# Altium footprint library LC-Standard-FootPrints-AD-V1.00工程师同事给的标准库（含3D）.PcbLib: 463 footprints (part 12 of 29)
Each footprint in its own frame and in the unit in brackets; x right, y up, seen from the top. Pads: shape width x height; smd on the part's side, far side on the other; paste and mask are expansions set on the pad; w line width, h text height; cw(c..) or ccw(c..) is an arc to the next point about the centre after c.
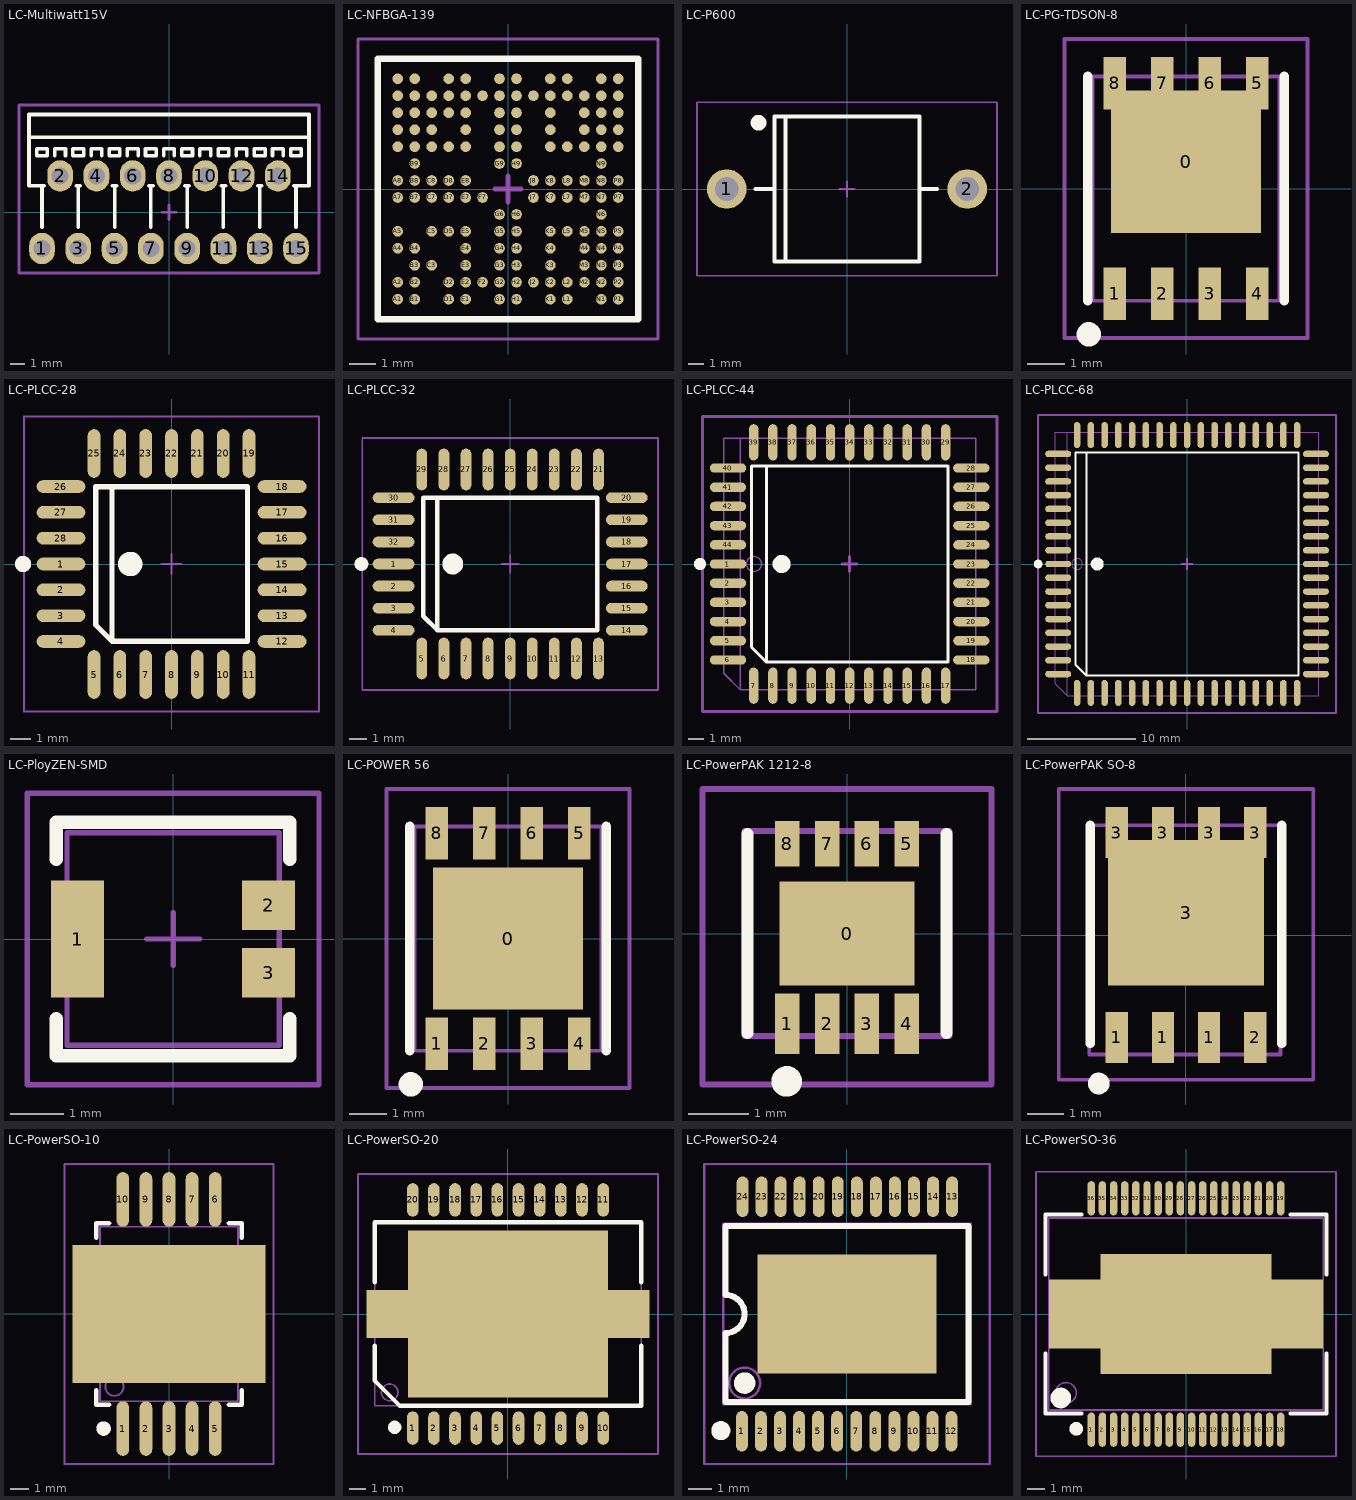
[diagram p11: the footprints below, top view; thin cyan lines are the x and y axes]

## LC-Multiwatt15V [mm]
pads (15):
  oval 1.8x2.2 hole 1.2: 1(-8.89,-2.54) 2(-7.62,2.54) 3(-6.35,-2.54) 4(-5.08,2.54) 5(-3.81,-2.54) 6(-2.54,2.54) 7(-1.27,-2.54) 8(0,2.54) 9(1.27,-2.54) 10(2.54,2.54) 11(3.81,-2.54) 12(5.08,2.54) 13(6.35,-2.54) 14(7.62,2.54) 15(8.89,-2.54)
Top Overlay:
  lines w0.254: -8.89,-1.06 -8.89,1.84 ; -8.74,1.84 -9.8,1.84 -9.8,5.24 ; -7.995,3.94 -7.995,4.44 -7.245,4.44 -7.245,3.94 ; -6.5,1.84 -6.2,1.84 ; -6.35,-1.06 -6.35,1.84 ; -5.455,3.94 -5.455,4.44 -4.705,4.44 -4.705,3.94 ; -3.96,1.84 -3.66,1.84 ; -3.81,-1.06 -3.81,1.84 ; -2.915,3.94 -2.915,4.44 -2.165,4.44 -2.165,3.94 ; -1.42,1.84 -1.12,1.84 ; -1.27,-1.06 -1.27,1.84 ; -0.375,3.94 -0.375,4.44 0.375,4.44 0.375,3.94 ; 1.12,1.84 1.42,1.84 ; 1.27,-1.06 1.27,1.84 ; 2.165,3.94 2.165,4.44 2.915,4.44 2.915,3.94 ; 3.66,1.84 3.96,1.84 ; 3.81,-1.06 3.81,1.84 ; 4.705,3.94 4.705,4.44 5.455,4.44 5.455,3.94 ; 6.2,1.84 6.5,1.84 ; 6.35,-1.06 6.35,1.84 ; 7.245,3.94 7.245,4.44 7.995,4.44 7.995,3.94 ; 8.74,1.84 9.8,1.84 9.8,5.24 ; 8.89,-1.06 8.89,1.84 ; -9.8,5.24 9.8,5.24 ; -9.8,5.24 -9.8,6.84 9.8,6.84 9.8,5.24 ; -9.265,3.94 -8.515,3.94 -8.515,4.44 -9.265,4.44 -9.265,3.94 ; -6.725,3.94 -5.975,3.94 -5.975,4.44 -6.725,4.44 -6.725,3.94 ; -4.185,3.94 -3.435,3.94 -3.435,4.44 -4.185,4.44 -4.185,3.94 ; -1.645,3.94 -1.645,4.44 -0.895,4.44 -0.895,3.94 -1.645,3.94 ; 0.895,3.94 1.645,3.94 1.645,4.44 0.895,4.44 0.895,3.94 ; 3.435,3.94 4.185,3.94 4.185,4.44 3.435,4.44 3.435,3.94 ; 5.975,3.94 6.725,3.94 6.725,4.44 5.975,4.44 5.975,3.94 ; 8.515,3.94 8.515,4.44 9.265,4.44 9.265,3.94 8.515,3.94
Mechanical 15:
  lines w0.2: -0.5,0 0.5,0 ; 0,-0.5 0,0.5 ; -10.5,-4.25 10.5,-4.25 10.5,7.5 -10.5,7.5 -10.5,-4.25

## LC-NFBGA-139 [mm]
pads (139):
  round 0.41 smd: A1(-4.225,-4.225) A2(-4.225,-3.575) A4(-4.225,-2.275) A5(-4.225,-1.625) A7(-4.225,-0.325) A8(-4.225,0.325) A10(-4.225,1.625) A11(-4.225,2.275) A12(-4.225,2.925) A13(-4.225,3.575) A14(-4.225,4.225) B1(-3.575,-4.225) B2(-3.575,-3.575) B3(-3.575,-2.925) B4(-3.575,-2.275) B7(-3.575,-0.325) B8(-3.575,0.325) B9(-3.575,0.975) B10(-3.575,1.625) B11(-3.575,2.275) B12(-3.575,2.925) B13(-3.575,3.575) B14(-3.575,4.225) C3(-2.925,-2.925) C5(-2.925,-1.625) C7(-2.925,-0.325) C8(-2.925,0.325) C10(-2.925,1.625) C11(-2.925,2.275) C12(-2.925,2.925) C13(-2.925,3.575) D1(-2.275,-4.225) D2(-2.275,-3.575) D5(-2.275,-1.625) D7(-2.275,-0.325) D8(-2.275,0.325) D10(-2.275,1.625) D12(-2.275,2.925) D13(-2.275,3.575) D14(-2.275,4.225) E1(-1.625,-4.225) E2(-1.625,-3.575) E3(-1.625,-2.925) E4(-1.625,-2.275) E5(-1.625,-1.625) E7(-1.625,-0.325) E8(-1.625,0.325) E10(-1.625,1.625) E11(-1.625,2.275) E12(-1.625,2.925) E13(-1.625,3.575) E14(-1.625,4.225) F2(-0.975,-3.575) F7(-0.975,-0.325) F13(-0.975,3.575) G1(-0.325,-4.225) G2(-0.325,-3.575) G3(-0.325,-2.925) G4(-0.325,-2.275) G5(-0.325,-1.625) G6(-0.325,-0.975) G9(-0.325,0.975) G10(-0.325,1.625) G11(-0.325,2.275) G12(-0.325,2.925) G13(-0.325,3.575) G14(-0.325,4.225) H1(0.325,-4.225) H2(0.325,-3.575) H3(0.325,-2.925) H4(0.325,-2.275) H5(0.325,-1.625) H6(0.325,-0.975) H9(0.325,0.975) H10(0.325,1.625) H11(0.325,2.275) H12(0.325,2.925) H13(0.325,3.575) H14(0.325,4.225) J2(0.975,-3.575) J7(0.975,-0.325) J8(0.975,0.325) J13(0.975,3.575) K1(1.625,-4.225) K2(1.625,-3.575) K3(1.625,-2.925) K4(1.625,-2.275) K5(1.625,-1.625) K7(1.625,-0.325) K8(1.625,0.325) K10(1.625,1.625) K11(1.625,2.275) K12(1.625,2.925) K13(1.625,3.575) K14(1.625,4.225) L1(2.275,-4.225) L2(2.275,-3.575) L5(2.275,-1.625) L7(2.275,-0.325) L8(2.275,0.325) L10(2.275,1.625) L13(2.275,3.575) L14(2.275,4.225) M2(2.925,-3.575) M3(2.925,-2.925) M4(2.925,-2.275) M5(2.925,-1.625) M7(2.925,-0.325) M8(2.925,0.325) M10(2.925,1.625) M11(2.925,2.275) M12(2.925,2.925) M13(2.925,3.575) N1(3.575,-4.225) N2(3.575,-3.575) N3(3.575,-2.925) N4(3.575,-2.275) N5(3.575,-1.625) N6(3.575,-0.975) N7(3.575,-0.325) N8(3.575,0.325) N9(3.575,0.975) N10(3.575,1.625) N11(3.575,2.275) N12(3.575,2.925) N13(3.575,3.575) N14(3.575,4.225) P1(4.225,-4.225) P2(4.225,-3.575) P3(4.225,-2.925) P4(4.225,-2.275) P5(4.225,-1.625) P7(4.225,-0.325) P8(4.225,0.325) P10(4.225,1.625) P11(4.225,2.275) P12(4.225,2.925) P13(4.225,3.575) P14(4.225,4.225)
Top Overlay:
  lines w0.254: -5,-5 5,-5 5,5 -5,5 -5,-5
Mechanical 15:
  lines w0.1: -5.75,-5.75 -5.75,5.75 5.75,5.75 5.75,-5.75 -5.75,-5.75
  lines w0.2: -0.5,0 0,0 ; 0,-0.5 0,0 ; 0,0.5 0,0 ; 0.5,0 0,0

## LC-P600 [mm]
pads (2):
  round 2.5 hole 1.5: 1(-7.62,0) 2(7.62,0)
Top Overlay:
  circle w0.5: c-5.6,4.2 r0.25
  lines w0.254: -5.8,0 -4.6,0 ; -3.9,-4.6 -3.9,4.6 ; 4.6,0 5.7,0 ; -4.6,-4.6 -4.6,4.6 4.6,4.6 4.6,-4.6 -4.6,-4.6
Mechanical 15:
  lines w0.1: -0.5,0 0.5,0 ; 0,-0.5 0,0.5 ; -9.5,-5.5 9.5,-5.5 9.5,5.5 -9.5,5.5 -9.5,-5.5

## LC-PG-TDSON-8 [mm]
pads (9):
  rect 4x3.81 smd: 0(0,0.716)
  rect 0.61x1.4 smd: 1(-1.905,-2.816) 2(-0.635,-2.816) 3(0.635,-2.816) 4(1.905,-2.816) 5(1.905,2.816) 6(0.635,2.816) 7(-0.635,2.816) 8(-1.905,2.816)
Top Overlay:
  circle w0.4: c-2.6,-3.9 r0.125
  lines w0.254: -2.63,-3 -2.63,3 ; 2.63,-3 2.63,3
Mechanical 13:
  lines w0.1: -2.5,-3 2.5,-3 2.5,3 -2.5,3 -2.5,-3
Mechanical 15:
  lines w0.1: -0.5,0 0.5,0 ; 0,-0.5 0,0.5 ; -3.25,-4 -3.25,4 3.25,4 3.25,-4 -3.25,-4

## LC-PLCC-28 [mm]
pads (28):
  oval 2.4x0.62 smd: 1(-5.435,0) 2(-5.435,-1.27) 3(-5.435,-2.54) 4(-5.435,-3.81) 12(5.435,-3.81) 13(5.435,-2.54) 14(5.435,-1.27) 15(5.435,0) 16(5.435,1.27) 17(5.435,2.54) 18(5.435,3.81) 26(-5.435,3.81) 27(-5.435,2.54) 28(-5.435,1.27)
  oval 0.62x2.4 smd: 5(-3.81,-5.435) 6(-2.54,-5.435) 7(-1.27,-5.435) 8(0,-5.435) 9(1.27,-5.435) 10(2.54,-5.435) 11(3.81,-5.435) 19(3.81,5.435) 20(2.54,5.435) 21(1.27,5.435) 22(0,5.435) 23(-1.27,5.435) 24(-2.54,5.435) 25(-3.81,5.435)
Top Overlay:
  circle w0.4: c-7.3,0 r0.2
  circle w0.6: c-2.03,0 r0.3
  lines w0.254: -2.93,3.8 -2.93,-3.8 ; -2.93,-3.8 -3.73,-3 -3.73,3.8 3.73,3.8 3.73,-3.8 -2.93,-3.8
Mechanical 15:
  lines w0.1: -0.5,0 0.5,0 ; 0,-0.5 0,0.5 ; -7.25,-7.25 -7.25,7.25 7.25,7.25 7.25,-7.25 -7.25,-7.25

## LC-PLCC-32 [mm]
pads (32):
  oval 2.4x0.62 smd: 1(-6.705,0) 2(-6.705,-1.27) 3(-6.705,-2.54) 4(-6.705,-3.81) 14(6.705,-3.81) 15(6.705,-2.54) 16(6.705,-1.27) 17(6.705,0) 18(6.705,1.27) 19(6.705,2.54) 20(6.705,3.81) 30(-6.705,3.81) 31(-6.705,2.54) 32(-6.705,1.27)
  oval 0.62x2.4 smd: 5(-5.08,-5.435) 6(-3.81,-5.435) 7(-2.54,-5.435) 8(-1.27,-5.435) 9(0,-5.435) 10(1.27,-5.435) 11(2.54,-5.435) 12(3.81,-5.435) 13(5.08,-5.435) 21(5.08,5.435) 22(3.81,5.435) 23(2.54,5.435) 24(1.27,5.435) 25(0,5.435) 26(-1.27,5.435) 27(-2.54,5.435) 28(-3.81,5.435) 29(-5.08,5.435)
Top Overlay:
  circle w0.6: c-3.3,0 r0.3
  circle w0.4: c-8.55,0 r0.2
  lines w0.254: -4.2,3.8 -4.2,-3.8 ; -4.2,-3.8 -5,-3 -5,3.8 5,3.8 5,-3.8 -4.2,-3.8
Mechanical 15:
  lines w0.1: -0.5,0 0.5,0 ; 0,-0.5 0,0.5 ; -8.5,-7.25 8.5,-7.25 8.5,7.25 -8.5,7.25 -8.5,-7.25

## LC-PLCC-44 [mm]
pads (44):
  oval 2.4x0.62 smd: 1(-8.05,0) 2(-8.05,-1.27) 3(-8.05,-2.54) 4(-8.05,-3.81) 5(-8.05,-5.08) 6(-8.05,-6.35) 18(8.05,-6.35) 19(8.05,-5.08) 20(8.05,-3.81) 21(8.05,-2.54) 22(8.05,-1.27) 23(8.05,0) 24(8.05,1.27) 25(8.05,2.54) 26(8.05,3.81) 27(8.05,5.08) 28(8.05,6.35) 40(-8.05,6.35) 41(-8.05,5.08) 42(-8.05,3.81) 43(-8.05,2.54) 44(-8.05,1.27)
  oval 0.62x2.4 smd: 7(-6.35,-8.05) 8(-5.08,-8.05) 9(-3.81,-8.05) 10(-2.54,-8.05) 11(-1.27,-8.05) 12(0,-8.05) 13(1.27,-8.05) 14(2.54,-8.05) 15(3.81,-8.05) 16(5.08,-8.05) 17(6.35,-8.05) 29(6.35,8.05) 30(5.08,8.05) 31(3.81,8.05) 32(2.54,8.05) 33(1.27,8.05) 34(0,8.05) 35(-1.27,8.05) 36(-2.54,8.05) 37(-3.81,8.05) 38(-5.08,8.05) 39(-6.35,8.05)
Top Overlay:
  circle w0.4: c-9.9,0 r0.2
  circle w0.6: c-4.5,0 r0.3
  lines w0.2: -5.5,6.5 -5.5,-6.5 ; -5.5,-6.5 -6.5,-5.5 -6.5,6.5 6.5,6.5 6.5,-6.5 -5.5,-6.5
Mechanical 13:
  circle w0.1: c-6.33,0 r0.5
  lines w0.1: -7.23,8.33 -7.23,-8.33 ; -7.23,-8.33 8.33,-8.33 8.33,8.33 -8.33,8.33 -8.33,-7.23 -7.23,-8.33
Mechanical 15:
  lines w0.2: -0.5,0 0.5,0 ; 0,-0.5 0,0.5 ; -9.75,-9.75 9.75,-9.75 9.75,9.75 -9.75,9.75 -9.75,-9.75

## LC-PLCC-68 [mm]
pads (68):
  oval 2.4x0.6 smd: 1(-11.9,0) 2(-11.9,-1.27) 3(-11.9,-2.54) 4(-11.9,-3.81) 5(-11.9,-5.08) 6(-11.9,-6.35) 7(-11.9,-7.62) 8(-11.9,-8.89) 9(-11.9,-10.16) 27(11.9,-10.16) 28(11.9,-8.89) 29(11.9,-7.62) 30(11.9,-6.35) 31(11.9,-5.08) 32(11.9,-3.81) 33(11.9,-2.54) 34(11.9,-1.27) 35(11.9,0) 36(11.9,1.27) 37(11.9,2.54) 38(11.9,3.81) 39(11.9,5.08) 40(11.9,6.35) 41(11.9,7.62) 42(11.9,8.89) 43(11.9,10.16) 61(-11.9,10.16) 62(-11.9,8.89) 63(-11.9,7.62) 64(-11.9,6.35) 65(-11.9,5.08) 66(-11.9,3.81) 67(-11.9,2.54) 68(-11.9,1.27)
  oval 0.6x2.4 smd: 10(-10.16,-11.9) 11(-8.89,-11.9) 12(-7.62,-11.9) 13(-6.35,-11.9) 14(-5.08,-11.9) 15(-3.81,-11.9) 16(-2.54,-11.9) 17(-1.27,-11.9) 18(0,-11.9) 19(1.27,-11.9) 20(2.54,-11.9) 21(3.81,-11.9) 22(5.08,-11.9) 23(6.35,-11.9) 24(7.62,-11.9) 25(8.89,-11.9) 26(10.16,-11.9) 44(10.16,11.9) 45(8.89,11.9) 46(7.62,11.9) 47(6.35,11.9) 48(5.08,11.9) 49(3.81,11.9) 50(2.54,11.9) 51(1.27,11.9) 52(0,11.9) 53(-1.27,11.9) 54(-2.54,11.9) 55(-3.81,11.9) 56(-5.08,11.9) 57(-6.35,11.9) 58(-7.62,11.9) 59(-8.89,11.9) 60(-10.16,11.9)
Top Overlay:
  circle w0.4: c-13.75,0 r0.2
  circle w0.6: c-8.3,0 r0.3
  lines w0.2: -9.3,10.3 -9.3,-10.3 ; -9.3,-10.3 -10.3,-9.3 -10.3,10.3 10.3,10.3 10.3,-10.3 -9.3,-10.3
Mechanical 13:
  circle w0.1: c-10.165,0 r0.5
  lines w0.1: -11.065,12.165 -11.065,-12.165 ; -11.065,-12.165 12.165,-12.165 12.165,12.165 -12.165,12.165 -12.165,-11.065 -11.065,-12.165
Mechanical 15:
  lines w0.2: -0.5,0 0.5,0 ; 0,-0.5 0,0.5 ; -13.75,-13.75 13.75,-13.75 13.75,13.75 -13.75,13.75 -13.75,-13.75

## LC-PloyZEN-SMD [mm] "Polymer Enhanced Zener Diode"
pads (3):
  rect 1x2.21 smd: 1(-1.8,0)
  rect 1x0.94 smd: 2(1.8,0.635) 3(1.8,-0.635)
Top Overlay:
  lines w0.254: -2.2,-1.5 -2.2,-2.2 2.2,-2.2 2.2,-1.5 ; -2.2,1.5 -2.2,2.2 2.2,2.2 2.2,1.5
Mechanical 13:
  lines w0.1: -2,-2 -2,2 2,2 2,-2 -2,-2
Mechanical 15:
  lines w0.1: -0.5,0 0.5,0 ; 0,-0.5 0,0.5 ; -2.75,-2.75 -2.75,2.75 2.75,2.75 2.75,-2.75 -2.75,-2.75

## LC-POWER 56 [mm]
pads (9):
  rect 4x3.81 smd: 0(0,0)
  rect 0.61x1.4 smd: 1(-1.905,-2.816) 2(-0.635,-2.816) 3(0.635,-2.816) 4(1.905,-2.816) 5(1.905,2.816) 6(0.635,2.816) 7(-0.635,2.816) 8(-1.905,2.816)
Top Overlay:
  circle w0.4: c-2.6,-3.9 r0.125
  lines w0.254: -2.63,-3 -2.63,3 ; 2.63,-3 2.63,3
Mechanical 13:
  lines w0.1: -2.5,-3 2.5,-3 2.5,3 -2.5,3 -2.5,-3
Mechanical 15:
  lines w0.1: -0.5,0 0.5,0 ; 0,-0.5 0,0.5 ; -3.25,-4 3.25,-4 3.25,4 -3.25,4 -3.25,-4

## LC-PowerPAK 1212-8 [mm]
pads (9):
  rect 2.235x1.725 smd: 0(0,0)
  rect 0.41x1 smd: 1(-0.99,-1.492) 2(-0.33,-1.492) 3(0.33,-1.492) 4(0.99,-1.492)
  rect 0.41x0.76 smd: 5(0.99,1.492) 6(0.33,1.492) 7(-0.33,1.492) 8(-0.99,1.492)
Top Overlay:
  circle w0.254: c-1,-2.45 r0.127
  lines w0.2: -1.65,-1.65 -1.65,1.65 ; 1.65,-1.65 1.65,1.65
Mechanical 13:
  lines w0.1: -1.7,-1.7 -1.7,1.7 1.7,1.7 1.7,-1.7 -1.7,-1.7
Mechanical 15:
  lines w0.1: -0.5,0 0.5,0 ; 0,-0.5 0,0.5 ; -2.4,-2.5 2.4,-2.5 2.4,2.4 -2.4,2.4 -2.4,-2.5

## LC-PowerPAK SO-8 [mm]
pads (9):
  rect 0.61x1.4 smd: 1(-1.905,-2.816) 1(-0.635,-2.816) 1(0.635,-2.816) 2(1.905,-2.816) 3(-1.905,2.816) 3(-0.635,2.816) 3(0.635,2.816) 3(1.905,2.816)
  rect 4.3x4 smd: 3(0,0.616)
Top Overlay:
  circle w0.3: c-2.4,-4.084 r0.15
  lines w0.254: -2.63,-2.984 -2.63,3.016 ; 2.63,-2.984 2.63,3.016
Mechanical 13:
  lines w0.1: -2.66,-3.284 2.6,-3.284 2.6,3.016 -2.66,3.016 -2.66,-3.284
Mechanical 15:
  lines w0.1: -0.5,0.016 0.5,0.016 ; 0,-0.484 0,0.516 ; -3.5,-3.984 3.5,-3.984 3.5,4.016 -3.5,4.016 -3.5,-3.984
3D body: height 1.04, standoff 0, extent -2.575,-3.184 2.575,2.966

## LC-PowerSO-10 [mm]
pads (11):
  oval 0.7x3 smd: 1(-2.54,-6.3) 2(-1.27,-6.3) 3(0,-6.3) 4(1.27,-6.3) 5(2.54,-6.3) 6(2.54,6.3) 7(1.27,6.3) 8(0,6.3) 9(-1.27,6.3) 10(-2.54,6.3)
  rect 10.6x7.6 smd: ""(0,0)
Top Overlay:
  circle w0.4: c-3.6,-6.3 r0.2
  lines w0.254: -4,-4.2 -4,-5 -3.3,-5 ; -4,4.2 -4,5 -3.3,5 ; 3.3,-5 4,-5 4,-4.2 ; 3.3,5 4,5 4,4.2
Mechanical 13:
  circle w0.1: c-3,-4 r0.5
  lines w0.1: -3.8,-4.8 -3.8,4.8 3.8,4.8 3.8,-4.8 -3.8,-4.8
Mechanical 15:
  lines w0.1: -5.75,-8.25 5.75,-8.25 5.75,8.25 -5.75,8.25 -5.75,-8.25
  lines w0.2: -0.5,0 0,0 ; 0,-0.5 0,0 ; 0,0.5 0,0 ; 0.5,0 0,0

## LC-PowerSO-20 [mm]
pads (22):
  oval 0.7x2 smd: 1(-5.715,-6.85) 2(-4.445,-6.85) 3(-3.175,-6.85) 4(-1.905,-6.85) 5(-0.635,-6.85) 6(0.635,-6.85) 7(1.905,-6.85) 8(3.175,-6.85) 9(4.445,-6.85) 10(5.715,-6.85) 11(5.715,6.85) 12(4.445,6.85) 13(3.175,6.85) 14(1.905,6.85) 15(0.635,6.85) 16(-0.635,6.85) 17(-1.905,6.85) 18(-3.175,6.85) 19(-4.445,6.85) 20(-5.715,6.85)
  rect 17x2.9 smd: ""(0,0)
  rect 12x10 smd: ""(0,0)
Top Overlay:
  circle w0.4: c-6.8,-6.8 r0.2
  lines w0.254: -8,-1.9 -8,-4 -6.5,-5.5 8,-5.5 8,-1.9 ; -8,1.9 -8,5.5 8,5.5 8,1.9
Mechanical 13:
  circle w0.1: c-7.1,-4.7 r0.5
  lines w0.1: -8,-5.5 8,-5.5 8,5.5 -8,5.5 -8,-5.5
Mechanical 15:
  lines w0.1: -9,-8.4 9,-8.4 9,8.4 -9,8.4 -9,-8.4
  lines w0.2: -0.5,0 0,0 ; 0,-0.5 0,0 ; 0,0.5 0,0 ; 0.5,0 0,0

## LC-PowerSO-24 [mm]
pads (25):
  oval 0.5x1.7 smd: 1(-4.412,-4.925) 2(-3.612,-4.925) 3(-2.812,-4.925) 4(-2.012,-4.925) 5(-1.212,-4.925) 6(-0.412,-4.925) 7(0.388,-4.925) 8(1.188,-4.925) 9(1.988,-4.925) 10(2.788,-4.925) 11(3.588,-4.925) 12(4.388,-4.925) 13(4.412,4.925) 14(3.612,4.925) 15(2.812,4.925) 16(2.012,4.925) 17(1.212,4.925) 18(0.412,4.925) 19(-0.388,4.925) 20(-1.188,4.925) 21(-1.988,4.925) 22(-2.788,4.925) 23(-3.588,4.925) 24(-4.388,4.925)
  rect 7.5x5 smd: ""(0,0)
Top Overlay:
  circle w0.5: c-4.3,-2.9 r0.2
  circle w0.4: c-5.3,-4.9 r0.2
  lines w0.254: -5.1,-3.7 -5.1,-0.8 ccw(c-5.1,0) -5.1,0.8 -5.1,3.7 5.1,3.7 5.1,-3.7 -5.1,-3.7
Mechanical 13:
  circle w0.1: c-4.3,-2.9 r0.65
  lines w0.1: -5.2,-3.8 5.2,-3.8 5.2,3.8 -5.2,3.8 -5.2,-3.8
Mechanical 15:
  lines w0.1: -0.5,0 0.5,0 ; 0,-0.5 0,0.5 ; -6,-6.3 -6,6.3 6,6.3 6,-6.3 -6,-6.3

## LC-PowerSO-36 [mm]
pads (38):
  oval 0.43x2 smd: 1(-5.525,-6.75) 2(-4.875,-6.75) 3(-4.225,-6.75) 4(-3.575,-6.75) 5(-2.925,-6.75) 6(-2.275,-6.75) 7(-1.625,-6.75) 8(-0.975,-6.75) 9(-0.325,-6.75) 10(0.325,-6.75) 11(0.975,-6.75) 12(1.625,-6.75) 13(2.275,-6.75) 14(2.925,-6.75) 15(3.575,-6.75) 16(4.225,-6.75) 17(4.875,-6.75) 18(5.525,-6.75) 19(5.525,6.75) 20(4.875,6.75) 21(4.225,6.75) 22(3.575,6.75) 23(2.925,6.75) 24(2.275,6.75) 25(1.625,6.75) 26(0.975,6.75) 27(0.325,6.75) 28(-0.325,6.75) 29(-0.975,6.75) 30(-1.625,6.75) 31(-2.275,6.75) 32(-2.925,6.75) 33(-3.575,6.75) 34(-4.225,6.75) 35(-4.875,6.75) 36(-5.525,6.75)
  rect 16x4 smd: ""(0,0)
  rect 10x7 smd: ""(0,0)
Top Overlay:
  circle w0.6: c-7.3,-4.9 r0.3
  circle w0.4: c-6.4,-6.7 r0.2
  lines w0.254: -8.2,-2.3 -8.2,-5.8 -6.1,-5.8 ; -8.2,2.3 -8.2,5.8 -6.1,5.8 ; 6.1,-5.8 8.2,-5.8 8.2,-2.3 ; 6.1,5.8 8.2,5.8 8.2,2.3
Mechanical 13:
  circle w0.1: c-7,-4.6 r0.6
  lines w0.1: -8,-5.6 8,-5.6 8,5.6 -8,5.6 -8,-5.6
Mechanical 15:
  lines w0.1: -8.75,-8.3 -8.75,8.3 8.75,8.3 8.75,-8.3 -8.75,-8.3
  lines w0.2: -0.5,0 0,0 ; 0,-0.5 0,0 ; 0,0.5 0,0 ; 0.5,0 0,0